# Altium footprint library 模块封装库.PcbLib: 20 footprints (part 1 of 2)
Each footprint in its own frame and in the unit in brackets; x right, y up, seen from the top. Pads: shape width x height; smd on the part's side, far side on the other; paste and mask are expansions set on the pad; w line width, h text height; cw(c..) or ccw(c..) is an arc to the next point about the centre after c.
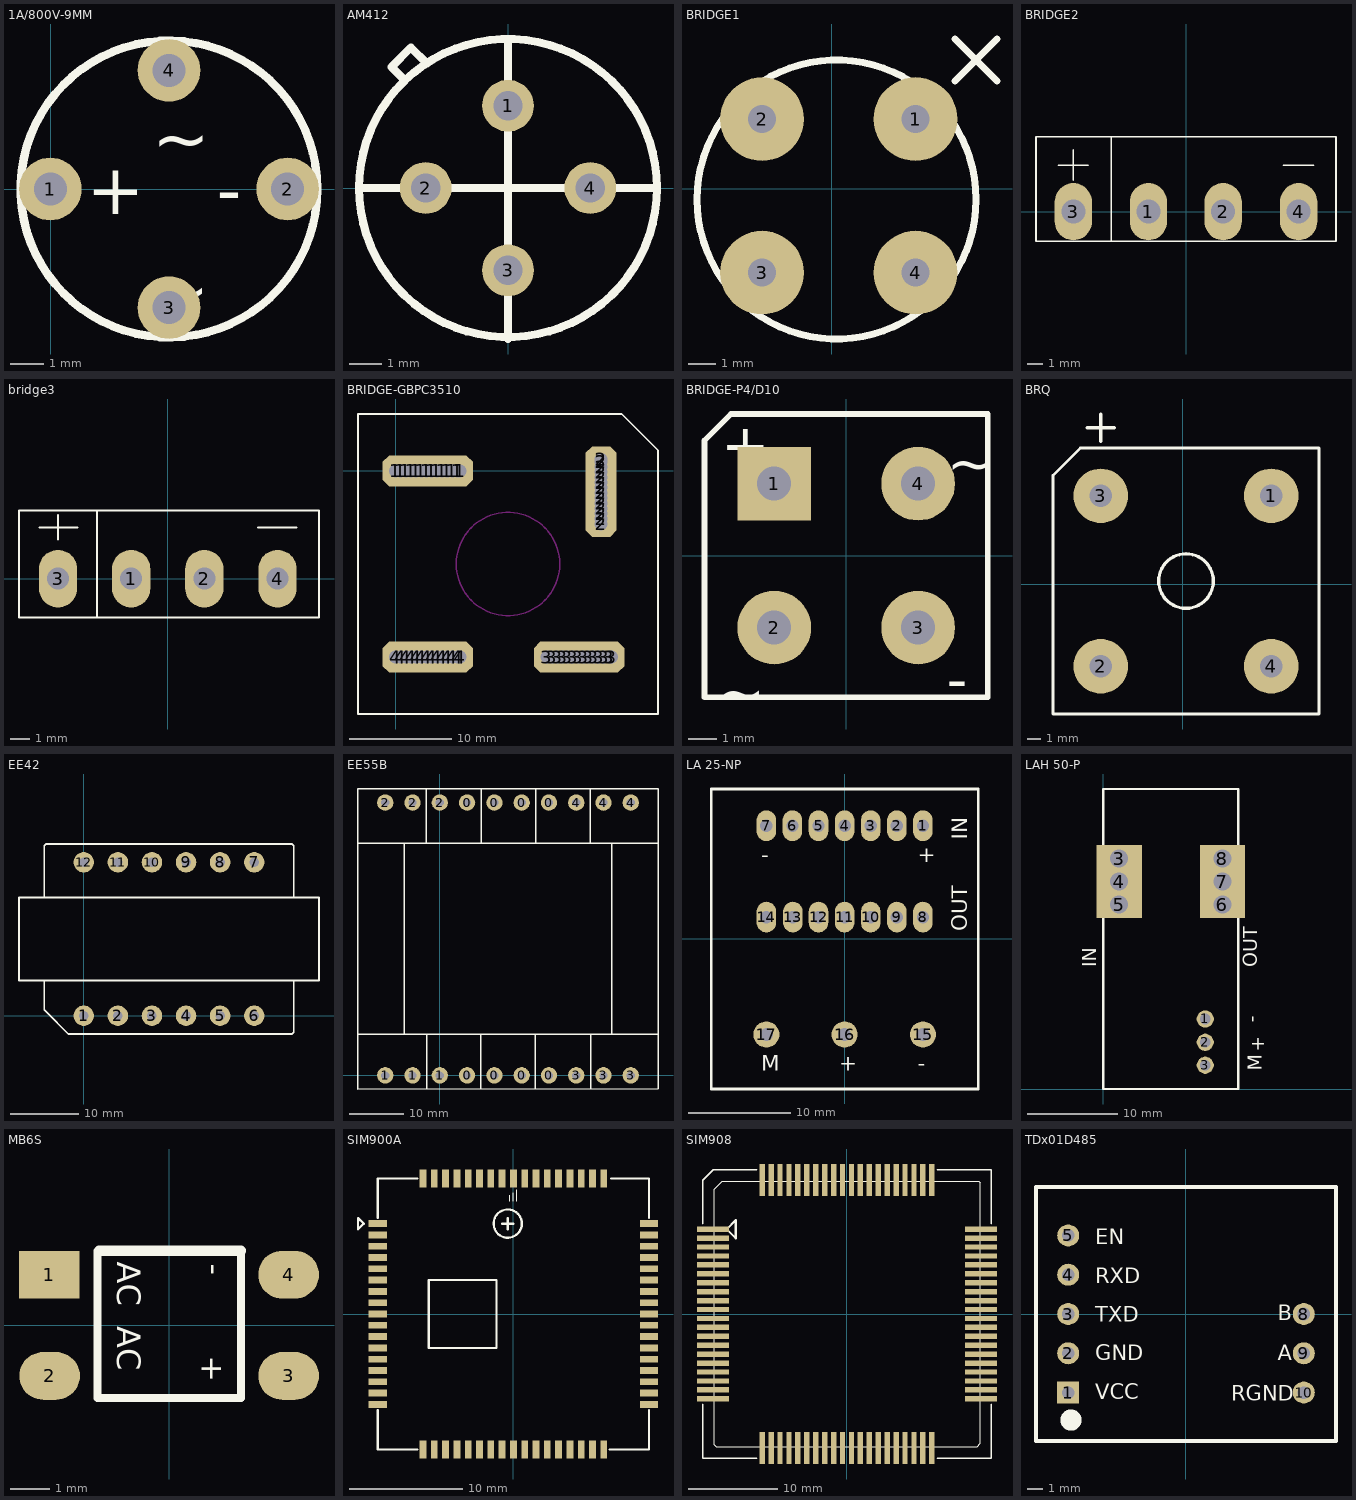
[diagram p0: the footprints below, top view; thin cyan lines are the x and y axes]

## 1A/800V-9MM [mm]
pads (4):
  round 1.9 hole 1: 1(-0.012,0.01) 2(7.188,0.01) 3(3.588,-3.59) 4(3.588,3.61)
Top Overlay:
  circle w0.254: c3.588,0.01 r4.5
  text "+" at 1.098,-0.76 h1.52
  text "-" at 5.038,-0.76 h1.52
  text "~" at 3.078,0.81 h1.52
  text "~" at 3.058,-3.82 h1.52

## AM412 [mm]
height 1.99
pads (4):
  round 1.6 hole 0.9: 1(0,2.54) 2(-2.54,0) 3(0,-2.54) 4(2.54,0)
Top Overlay:
  circle w0.254: c0,0 r4.6
  lines w0.25: -4.6,0 4.54,0 ; -3.2,3.34 -3.6,3.74 -3,4.34 ; -2.5,3.84 -3,4.34 ; 0,-4.66 0,4.54 ; -3,4.34 -3,4.34
3D body: height 10, standoff 5, extent -4.704,-4.671 4.46,4.511
3D body: height 6, standoff 5, extent -3.64,3.38 -2.43,4.39
3D body: height 5, standoff -1, extent 2.044,-0.499 3.04,0.499
3D body: height 5, standoff -1, extent -0.496,2.041 0.5,3.039
3D body: height 5, standoff -1, extent -3.036,-0.499 -2.04,0.499
3D body: height 5, standoff -1, extent -0.496,-3.039 0.5,-2.041

## BRIDGE1 [mil]
pads (4):
  round 120 hole 40: 1(120,100) 2(-100,100) 3(-100,-120) 4(120,-120)
Top Overlay:
  circle w10: c6.8,-15.2 r200
  lines w10: 176.8,154.8 236.8,214.8 ; 176.8,214.8 236.8,154.8

## BRIDGE2 [mil]
pads (4):
  oval 98x150 hole 63: 1(-98.5,0) 2(97.5,0) 3(-295.5,0) 4(295.5,0)
Top Overlay:
  lines w4: -334.5,122 -256.5,122 ; -295.5,83 -295.5,162 ; -196.5,-78 -196.5,197 ; 255.5,122 334.5,122 ; -393.5,-78 393.5,-78 393.5,197 -393.5,197 -393.5,-78

## bridge3 [mm]
pads (4):
  oval 2x3 hole 1.143: 1(-1.905,0) 2(1.905,0) 3(-5.715,0) 4(5.715,0)
Top Overlay:
  lines w0.102: -6.68,2.667 -4.699,2.667 ; -5.715,2.032 -5.715,3.302 ; -3.683,-2.032 -3.683,3.556 ; 4.699,2.667 6.706,2.667 ; -7.747,-2.032 7.874,-2.032 7.874,3.556 -7.747,3.556 -7.747,-2.032

## BRIDGE-GBPC3510 [mil]
pads (56):
  oct 100x120 hole 50: 1(0,0) 1(20,0) 1(40,0) 1(60,0) 1(80,0) 1(100,0) 1(120,0) 1(140,0) 1(160,0) 1(180,0) 1(200,0) 1(220,0) 1(240,0) 1(250,0) 3(585,-720) 3(605,-720) 3(625,-720) 3(645,-720) 3(665,-720) 3(685,-720) 3(705,-720) 3(725,-720) 3(745,-720) 3(765,-720) 3(785,-720) 3(805,-720) 3(825,-720) 3(835,-720) 4(0,-720) 4(20,-720) 4(40,-720) 4(60,-720) 4(80,-720) 4(100,-720) 4(120,-720) 4(140,-720) 4(160,-720) 4(180,-720) 4(200,-720) 4(220,-720) 4(240,-720) 4(250,-720)
  oct 120x100 hole 50: 2(795,-205) 2(795,-165) 2(795,-145) 2(795,-125) 2(795,-105) 2(795,-85) 2(795,-65) 2(795,-45) 2(795,-25) 2(795,-5) 2(795,15) 2(795,35) 2(795,45) 2(795,-185)
Top Overlay:
  lines w6: -145,-940 1015,-940 1015,80 875,220 -145,220 -145,-940
Keep-Out Layer:
  circle w6: c435,-360 r200
3D body: height 374.02, standoff -492.13, extent -141.18,-922.36 961.18,180

## BRIDGE-P4/D10 [mm]
pads (4):
  rect 2.6x2.6 hole 1.2: 1(-2.54,2.54)
  round 2.6 hole 1.2: 2(-2.54,-2.54) 3(2.54,-2.54) 4(2.54,2.54)
Top Overlay:
  lines w0.2: -5,-5 -5,4.064 ; -5,-5 5,-5 ; -5,-5 5,-5 ; -5,-5 -5,4.064 ; -5,4.064 -4.064,5 ; -5,4.064 -4.064,5 ; -4.064,5 5,5 ; -4.064,5 5,5 ; 5,-5 5,5 ; 5,-5 5,5
  text "+" at -4.41,3.164 h1.5
  text "-" at 3.556,-5.08 h1.5
  text "~" at -4.572,-5.588 h1.5
  text "~" at 3.556,2.54 h1.5
3D body: height 3, standoff -2, extent -3.286,-3.286 -1.794,-1.794
3D body: height 3, standoff -2, extent 1.794,1.794 3.286,3.286
3D body: height 3, standoff -2, extent 1.794,-3.286 3.286,-1.794
3D body: height 3, standoff -2, extent -3.286,1.794 -1.794,3.286
3D body: height 3, standoff 1, extent -5.08,-5.08 5.08,5.08

## BRQ [mil]
pads (4):
  round 160 hole 65: 1(260,260) 2(-240,-240) 3(-240,260) 4(260,-240)
Top Overlay:
  circle w10: c10.04,10.04 r80
  lines w8: -380,-380 -380,320 -300,400 400,400 400,-380 -380,-380
  lines w10: -280,460 -200,460 ; -240,420 -240,500

## EE42 [mm]
pads (12):
  round 3 hole 1.4: 1(0,0) 2(5,0) 3(10,0) 4(15,0) 5(20,0) 6(25,0) 7(25,22.5) 8(20,22.5) 9(15,22.5) 10(10,22.5) 11(5,22.5) 12(0,22.5)
Top Overlay:
  lines w0.254: -5.788,5.15 -5.788,0.856 -5.5,0.568 -2.232,-2.7 30.5,-2.7 30.788,-2.412 30.788,5.15 ; -5.788,17.35 -5.788,24.912 -5.5,25.2 30.5,25.2 30.788,24.912 30.788,17.35 ; -9.5,5.15 -9.5,17.35 34.5,17.35 34.5,5.15 -9.5,5.15
3D body: height 50.74, standoff -3.81, extent -8.001,-4.699 37.999,27.301

## EE55B [mm]
pads (20):
  round 3 hole 1.5: 0(5,0) 0(5,50) 0(10,0) 0(10,50) 0(15,0) 0(15,50) 0(20,0) 0(20,50) 1(-10,0) 1(-5,0) 1(0,0) 2(-10,50) 2(-5,50) 2(0,50) 3(25,0) 3(30,0) 3(35,0) 4(25,50) 4(30,50) 4(35,50)
Top Overlay:
  lines w0.254: -15,7.508 39.991,7.508 ; -15,42.534 39.991,42.534 ; -6.491,7.508 -6.491,42.534 ; -2.478,42.534 -2.478,52.491 ; -2.427,-2.5 -2.427,7.508 ; 7.479,-2.424 7.479,7.457 ; 7.581,42.534 7.581,52.491 ; 17.461,-2.475 17.461,7.508 ; 17.537,42.636 17.537,52.491 ; 27.57,42.585 27.57,52.491 ; 27.697,-2.424 27.697,7.406 ; 31.507,7.508 31.507,42.534 ; -15,-2.5 39.991,-2.475 39.991,52.491 -15,52.491 -15,-2.5
3D body: height 49.78, standoff -4.45, extent -15.113,-2.794 40.717,52.336

## LA 25-NP [mm] "LEM电流变送器"
height 16.5
pads (17):
  oval 1.905x3 hole 1.2: 1(7.62,11.02) 2(5.08,11.02) 3(2.54,11.02) 4(0,11.02) 5(-2.54,11.02) 6(-5.08,11.02) 7(-7.62,11.02) 8(7.62,2.13) 9(5.08,2.13) 10(2.54,2.13) 11(0,2.13) 12(-2.54,2.13) 13(-5.04,2.13) 14(-7.62,2.13)
  round 2.54 hole 1.27: 15(7.62,-9.3) 16(0,-9.3) 17(-7.62,-9.3)
Top Overlay:
  lines w0.254: -13,-14.6 -13,14.6 13,14.6 13,-14.6 -13,-14.6
  text "OUT" at 11.938,0.762 h1.52
  text "IN" at 11.938,9.652 h1.52
  text "+" at 7.112,7.493 h1.52
  text "-" at -8.128,7.493 h1.52
  text "-" at 7.112,-12.827 h1.52
  text "+" at -0.508,-12.827 h1.52
  text "M" at -8.128,-12.827 h1.52

## LAH 50-P [mm] "LEM电流变送器"
height 21.15
pads (9):
  round 1.905 hole 1.2: 1(11.275,7.747) 2(11.275,5.17) 3(11.275,2.63)
  rect 5x3 hole 2 square: 3(1.75,25.49) 4(1.75,22.95) 5(1.75,20.41) 6(13.18,20.41) 7(13.18,22.95) 8(13.18,25.49)
Top Overlay:
  lines w0.254: 0,0 14.93,0 14.93,33.2 0,33.2 0,0
  text "IN" at -0.762,13.462 h1.52
  text "OUT" at 17.018,13.462 h1.52
  text "M" at 17.526,2.032 h1.52
  text "+" at 16.256,4.318 h1.52
  text "-" at 16.002,8.128 h1.52

## MB6S [mm]
height 1.99
pads (4):
  rect 1.524x1.2 smd: 1(-3.004,1.267)
  oval 1.524x1.2 smd: 2(-2.996,-1.27) 3(3.004,-1.27) 4(3.004,1.27)
Top Overlay:
  lines w0.2: -1.796,1.87 -1.796,-1.83 1.804,-1.83 1.804,1.87
  lines w0.254: -1.759,1.87 1.804,1.87
  text "+        -" at 1.518,-1.425 h1
  text "AC  AC" at -1.505,1.598 h1
3D body: height 2.9, standoff 0, extent -3.346,-2.438 3.339,2.512

## SIM900A [mm]
pads (68):
  rect 1.6x0.6 smd: 1(-12,8) 2(-12,7) 3(-12,6) 4(-12,5) 5(-12,4) 6(-12,3) 7(-12,2) 8(-12,1) 9(-12,0) 10(-12,-1) 11(-12,-2) 12(-12,-3) 13(-12,-4) 14(-12,-5) 15(-12,-6) 16(-12,-7) 17(-12,-8) 35(12,-8) 36(12,-7) 37(12,-6) 38(12,-5) 39(12,-4) 40(12,-3) 41(12,-2) 42(12,-1) 43(12,0) 44(12,1) 45(12,2) 46(12,3) 47(12,4) 48(12,5) 49(12,6) 50(12,7) 51(12,8)
  rect 0.6x1.6 smd: 18(-8,-12) 19(-7,-12) 20(-6,-12) 21(-5,-12) 22(-4,-12) 23(-3,-12) 24(-2,-12) 25(-1,-12) 26(0,-12) 27(1,-12) 28(2,-12) 29(3,-12) 30(4,-12) 31(5,-12) 32(6,-12) 33(7,-12) 34(8,-12) 52(8,12) 53(7,12) 54(6,12) 55(5,12) 56(4,12) 57(3,12) 58(2,12) 59(1,12) 60(0,12) 61(-1,12) 62(-2,12) 63(-3,12) 64(-4,12) 65(-5,12) 66(-6,12) 67(-7,12) 68(-8,12)
Top Overlay:
  circle w0.203: c-0.5,8 r1.25
  lines w0.1: -0.3,10 -0.3,10.5 ; 0,10 0,10.75 ; 0.3,10 0.3,11 ; -13.75,7.5 -13.75,8.5 -13.25,8 -13.75,7.5
  lines w0.203: -12,-8.51 -12,-12 -8.505,-12 ; -12,8.508 -12,12 -8.507,12 ; -1,8 0,8 ; -0.5,7.5 -0.5,8.5 ; 8.508,-12 12,-12 12,-8.513 ; 8.637,12 12,12 12,8.511 ; -13.75,7.5 -13.25,8 -13.75,8.5 -13.75,7.5 ; -7.5,-3 -7.5,3 -1.5,3 -1.5,-3 -7.5,-3
3D body: height 3.02, standoff 0, extent -12.062,-12.128 11.938,11.872

## SIM908 [mm]
height 3.2
pads (80):
  rect 3.6x0.6 smd: 1(-15,9.5) 2(-15,8.5) 3(-15,7.5) 4(-15,6.5) 5(-15,5.5) 6(-15,4.5) 7(-15,3.5) 8(-15,2.5) 9(-15,1.5) 10(-15,0.5) 11(-15,-0.5) 12(-15,-1.5) 13(-15,-2.5) 14(-15,-3.5) 15(-15,-4.5) 16(-15,-5.5) 17(-15,-6.5) 18(-15,-7.5) 19(-15,-8.5) 20(-15,-9.5) 41(15,-9.5) 42(15,-8.5) 43(15,-7.5) 44(15,-6.5) 45(15,-5.5) 46(15,-4.5) 47(15,-3.5) 48(15,-2.5) 49(15,-1.5) 50(15,-0.5) 51(15,0.5) 52(15,1.5) 53(15,2.5) 54(15,3.5) 55(15,4.5) 56(15,5.5) 57(15,6.5) 58(15,7.5) 59(15,8.5) 60(15,9.5)
  rect 0.6x3.6 smd: 21(-9.5,-15) 22(-8.5,-15) 23(-7.5,-15) 24(-6.5,-15) 25(-5.5,-15) 26(-4.5,-15) 27(-3.5,-15) 28(-2.5,-15) 29(-1.5,-15) 30(-0.5,-15) 31(0.5,-15) 32(1.5,-15) 33(2.5,-15) 34(3.5,-15) 35(4.5,-15) 36(5.5,-15) 37(6.5,-15) 38(7.5,-15) 39(8.5,-15) 40(9.5,-15) 61(9.5,15) 62(8.5,15) 63(7.5,15) 64(6.5,15) 65(5.5,15) 66(4.5,15) 67(3.5,15) 68(2.5,15) 69(1.5,15) 70(0.5,15) 71(-0.5,15) 72(-1.5,15) 73(-2.5,15) 74(-3.5,15) 75(-4.5,15) 76(-5.5,15) 77(-6.5,15) 78(-7.5,15) 79(-8.5,15) 80(-9.5,15)
Top Overlay:
  lines w0.127: -14.848,-14.655 -14.848,10.084 -14.848,13.996 -14.136,14.707 -13.959,14.885 13.499,14.885 14.743,14.885 14.947,14.682 14.947,9.348 14.947,-14.478 14.566,-14.859 7.301,-14.859 -14.644,-14.859 -14.848,-14.655
  lines w0.2: -16.15,-10.1 -16.15,-16.15 -10.1,-16.15 ; -16.15,10.1 -16.15,15 -15,16.15 -10.1,16.15 ; 10.1,-16.15 16.15,-16.15 16.15,-10.1 ; 10.1,16.15 16.15,16.15 16.15,10.1
  lines w0.254: -13.476,9.5 -12.46,8.484 -12.46,10.516 -13.476,9.5
3D body: height 3.19, standoff -0.01, extent -15,-15 15,15

## TDx01D485 [mil]
height 78.35
pads (8):
  rect 56x56 hole 32: 1(-300,-200)
  round 56 hole 32: 2(-300,-100) 3(-300,0) 4(-300,100) 5(-300,200) 8(300,0) 9(300,-100) 10(300,-200)
Top Overlay:
  circle w30: c-293,-270 r12
  lines w10: -382,-323 382,-323 382,323 -382,323 -382,-323
  text "RGND" at 115.1,-220.6 h39.37
  text "A" at 233.18,-118.24 h39.37
  text "B" at 233.18,-15.87 h39.37
  text "EN" at -231.35,177.04 h39.37
  text "RXD" at -231.35,78.61 h39.37
  text "TXD" at -231.35,-19.81 h39.37
  text "GND" at -231.35,-118.24 h39.37
  text "VCC" at -231.35,-216.66 h39.37
3D body: height 295.28, standoff -78.74, extent -400,-380.32 387.4,288.98